# Altium schematic symbol library Regulator_Linear.SchLib: 1538 symbols (part 8 of 9)
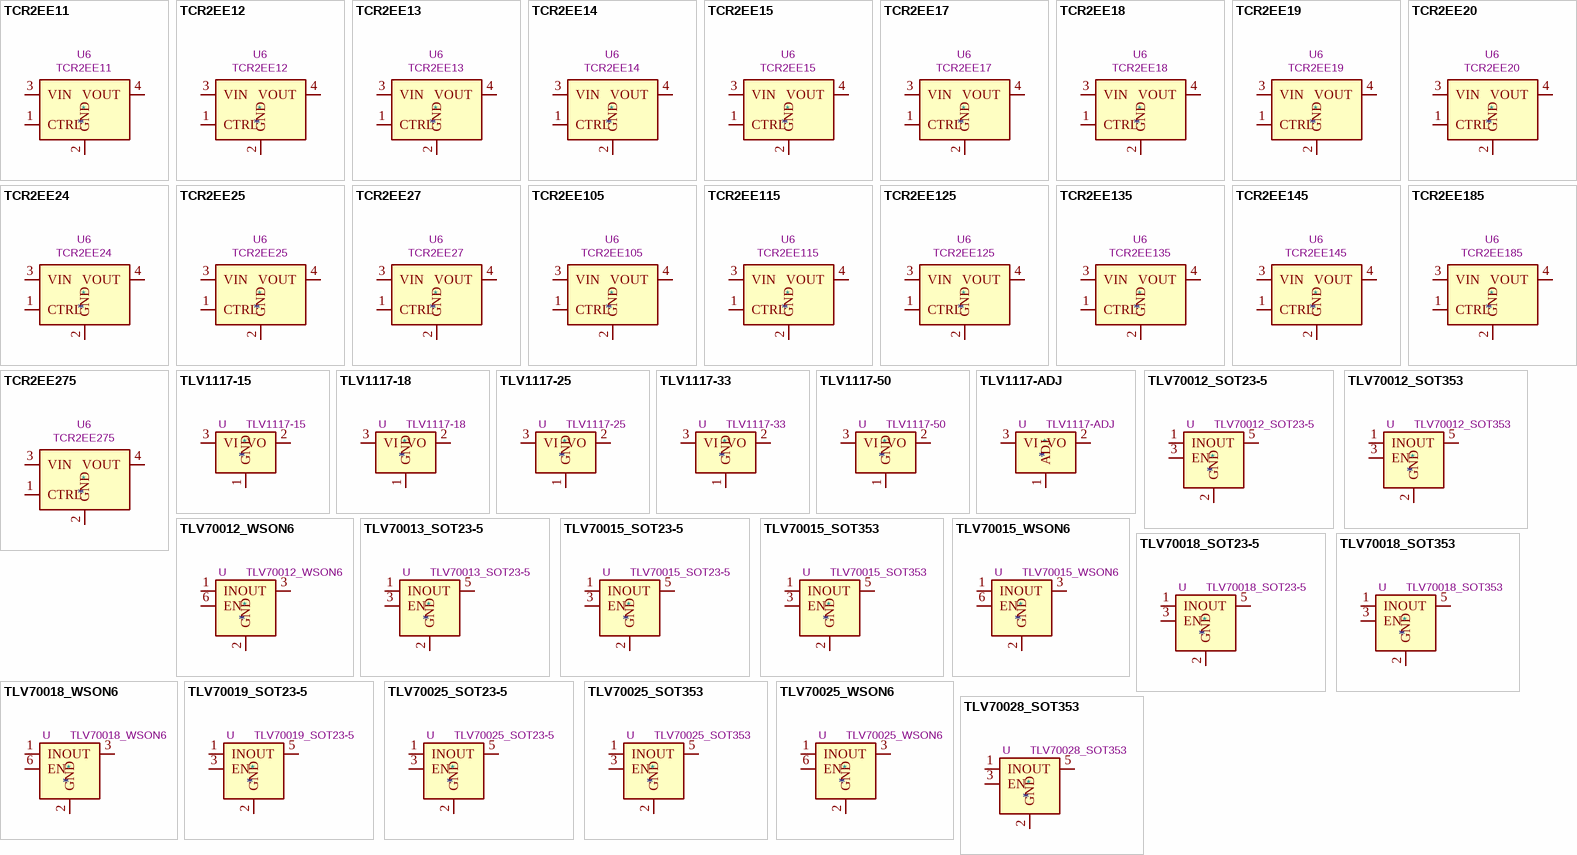
[diagram p45: symbols TCR2EE11 to TLV70028_SOT353]

## TLV1117-ADJ
designator *  value TLV1117-ADJ  Reference: U
ki_keywords: linear regulator ldo adjustable positive; ki_description: 800mA Low-Dropout Linear Regulator, adjustable output, TO-220/TO-252/TO-263/SOT-223; ki_fp_filters: SOT?223* TO?263* TO?252* TO?220*; Datasheet: http://www.ti.com/lit/ds/symlink/tlv1117.pdf
pins: 1 ADJ, 2 VO, 3 VI

## TLV70012_SOT23-5
designator *  value TLV70012_SOT23-5  Reference: U
ki_keywords: 200mA LDO Regulator Fixed Positive; ki_description: 200mA Low Dropout Voltage Regulator, Fixed Output 1.2V, SOT-23-5; ki_fp_filters: SOT?23*; Footprint: Package_TO_SOT_SMD:SOT-23-5; Datasheet: http://www.ti.com/lit/ds/symlink/tlv700.pdf
pins: 1 IN, 2 GND, 3 EN, 4 NC hidden, 5 OUT

## TLV70012_SOT353
designator *  value TLV70012_SOT353  Reference: U
ki_keywords: 200mA LDO Regulator Fixed Positive; ki_description: 200mA Low Dropout Voltage Regulator, Fixed Output 1.2V, SOT-23-5/SC-70-5/SOT-353; ki_fp_filters: SOT*353*; Footprint: Package_TO_SOT_SMD:SOT-353_SC-70-5; Datasheet: http://www.ti.com/lit/ds/symlink/tlv700.pdf
pins: 1 IN, 2 GND, 3 EN, 4 NC hidden, 5 OUT

## TLV70012_WSON6
designator *  value TLV70012_WSON6  Reference: U
ki_keywords: 200mA LDO Regulator Fixed Positive; ki_description: 200mA Low Dropout Voltage Regulator, Fixed Output 1.2V, WSON6; ki_fp_filters: WSON*; Footprint: Package_SON:WSON-6_1.5x1.5mm_P0.5mm; Datasheet: http://www.ti.com/lit/ds/symlink/tlv700.pdf
pins: 1 IN, 2 GND, 3 OUT, 4 NC hidden, 5 NC hidden, 6 EN

## TLV70013_SOT23-5
designator *  value TLV70013_SOT23-5  Reference: U
ki_keywords: 200mA LDO Regulator Fixed Positive; ki_description: 200mA Low Dropout Voltage Regulator, Fixed Output 1.3V, SOT-23-5; ki_fp_filters: SOT?23*; Footprint: Package_TO_SOT_SMD:SOT-23-5; Datasheet: http://www.ti.com/lit/ds/symlink/tlv700.pdf
pins: 1 IN, 2 GND, 3 EN, 4 NC hidden, 5 OUT

## TLV70015_SOT23-5
designator *  value TLV70015_SOT23-5  Reference: U
ki_keywords: 200mA LDO Regulator Fixed Positive; ki_description: 200mA Low Dropout Voltage Regulator, Fixed Output 1.5V, SOT-23-5; ki_fp_filters: SOT?23*; Footprint: Package_TO_SOT_SMD:SOT-23-5; Datasheet: http://www.ti.com/lit/ds/symlink/tlv700.pdf
pins: 1 IN, 2 GND, 3 EN, 4 NC hidden, 5 OUT

## TLV70015_SOT353
designator *  value TLV70015_SOT353  Reference: U
ki_keywords: 200mA LDO Regulator Fixed Positive; ki_description: 200mA Low Dropout Voltage Regulator, Fixed Output 1.5V, SOT-23-5/SC-70-5/SOT-353; ki_fp_filters: SOT*353*; Footprint: Package_TO_SOT_SMD:SOT-353_SC-70-5; Datasheet: http://www.ti.com/lit/ds/symlink/tlv700.pdf
pins: 1 IN, 2 GND, 3 EN, 4 NC hidden, 5 OUT

## TLV70015_WSON6
designator *  value TLV70015_WSON6  Reference: U
ki_keywords: 200mA LDO Regulator Fixed Positive; ki_description: 200mA Low Dropout Voltage Regulator, Fixed Output 1.5V, WSON6; ki_fp_filters: WSON*; Footprint: Package_SON:WSON-6_1.5x1.5mm_P0.5mm; Datasheet: http://www.ti.com/lit/ds/symlink/tlv700.pdf
pins: 1 IN, 2 GND, 3 OUT, 4 NC hidden, 5 NC hidden, 6 EN

## TLV70018_SOT23-5
designator *  value TLV70018_SOT23-5  Reference: U
ki_keywords: 200mA LDO Regulator Fixed Positive; ki_description: 200mA Low Dropout Voltage Regulator, Fixed Output 1.8V, SOT-23-5; ki_fp_filters: SOT?23*; Footprint: Package_TO_SOT_SMD:SOT-23-5; Datasheet: http://www.ti.com/lit/ds/symlink/tlv700.pdf
pins: 1 IN, 2 GND, 3 EN, 4 NC hidden, 5 OUT

## TLV70018_SOT353
designator *  value TLV70018_SOT353  Reference: U
ki_keywords: 200mA LDO Regulator Fixed Positive; ki_description: 200mA Low Dropout Voltage Regulator, Fixed Output 1.8V, SC70-5; ki_fp_filters: SOT*353*; Footprint: Package_TO_SOT_SMD:SOT-353_SC-70-5; Datasheet: http://www.ti.com/lit/ds/symlink/tlv700.pdf
pins: 1 IN, 2 GND, 3 EN, 4 NC hidden, 5 OUT

## TLV70018_WSON6
designator *  value TLV70018_WSON6  Reference: U
ki_keywords: 200mA LDO Regulator Fixed Positive; ki_description: 200mA Low Dropout Voltage Regulator, Fixed Output 1.8V, WSON6; ki_fp_filters: WSON*; Footprint: Package_SON:WSON-6_1.5x1.5mm_P0.5mm; Datasheet: http://www.ti.com/lit/ds/symlink/tlv700.pdf
pins: 1 IN, 2 GND, 3 OUT, 4 NC hidden, 5 NC hidden, 6 EN

## TLV70019_SOT23-5
designator *  value TLV70019_SOT23-5  Reference: U
ki_keywords: 200mA LDO Regulator Fixed Positive; ki_description: 200mA Low Dropout Voltage Regulator, Fixed Output 1.9V, SOT-23-5; ki_fp_filters: SOT?23*; Footprint: Package_TO_SOT_SMD:SOT-23-5; Datasheet: http://www.ti.com/lit/ds/symlink/tlv700.pdf
pins: 1 IN, 2 GND, 3 EN, 4 NC hidden, 5 OUT

## TLV70025_SOT23-5
designator *  value TLV70025_SOT23-5  Reference: U
ki_keywords: 200mA LDO Regulator Fixed Positive; ki_description: 200mA Low Dropout Voltage Regulator, Fixed Output 2.5V, SOT-23-5; ki_fp_filters: SOT?23*; Footprint: Package_TO_SOT_SMD:SOT-23-5; Datasheet: http://www.ti.com/lit/ds/symlink/tlv700.pdf
pins: 1 IN, 2 GND, 3 EN, 4 NC hidden, 5 OUT

## TLV70025_SOT353
designator *  value TLV70025_SOT353  Reference: U
ki_keywords: 200mA LDO Regulator Fixed Positive; ki_description: 200mA Low Dropout Voltage Regulator, Fixed Output 2.5V, SC70-5; ki_fp_filters: SOT*353*; Footprint: Package_TO_SOT_SMD:SOT-353_SC-70-5; Datasheet: http://www.ti.com/lit/ds/symlink/tlv700.pdf
pins: 1 IN, 2 GND, 3 EN, 4 NC hidden, 5 OUT

## TLV70025_WSON6
designator *  value TLV70025_WSON6  Reference: U
ki_keywords: 200mA LDO Regulator Fixed Positive; ki_description: 200mA Low Dropout Voltage Regulator, Fixed Output 2.5V, WSON6; ki_fp_filters: WSON*; Footprint: Package_SON:WSON-6_1.5x1.5mm_P0.5mm; Datasheet: http://www.ti.com/lit/ds/symlink/tlv700.pdf
pins: 1 IN, 2 GND, 3 OUT, 4 NC hidden, 5 NC hidden, 6 EN

## TLV70028_SOT353
designator *  value TLV70028_SOT353  Reference: U
ki_keywords: 200mA LDO Regulator Fixed Positive; ki_description: 200mA Low Dropout Voltage Regulator, Fixed Output 2.8V, SC70-5; ki_fp_filters: SOT*353*; Footprint: Package_TO_SOT_SMD:SOT-353_SC-70-5; Datasheet: http://www.ti.com/lit/ds/symlink/tlv700.pdf
pins: 1 IN, 2 GND, 3 EN, 4 NC hidden, 5 OUT

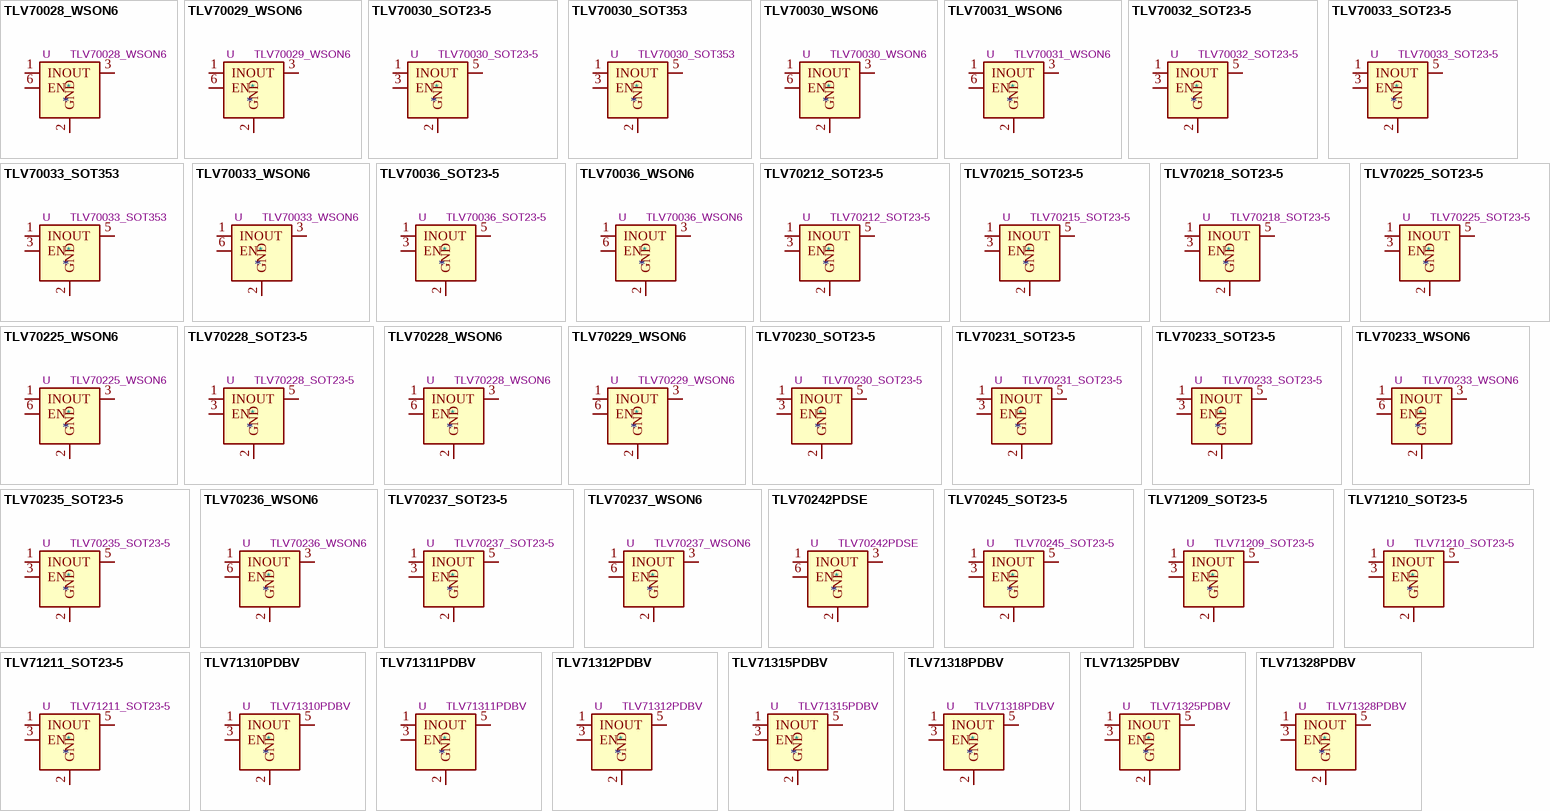
[diagram p32: symbols TLV70028_WSON6 to TLV71328PDBV]

## TLV70028_WSON6
designator *  value TLV70028_WSON6  Reference: U
ki_keywords: 200mA LDO Regulator Fixed Positive; ki_description: 200mA Low Dropout Voltage Regulator, Fixed Output 2.8V, WSON6; ki_fp_filters: WSON*; Footprint: Package_SON:WSON-6_1.5x1.5mm_P0.5mm; Datasheet: http://www.ti.com/lit/ds/symlink/tlv700.pdf
pins: 1 IN, 2 GND, 3 OUT, 4 NC hidden, 5 NC hidden, 6 EN

## TLV70029_WSON6
designator *  value TLV70029_WSON6  Reference: U
ki_keywords: 200mA LDO Regulator Fixed Positive; ki_description: 200mA Low Dropout Voltage Regulator, Fixed Output 2.9V, WSON6; ki_fp_filters: WSON*; Footprint: Package_SON:WSON-6_1.5x1.5mm_P0.5mm; Datasheet: http://www.ti.com/lit/ds/symlink/tlv700.pdf
pins: 1 IN, 2 GND, 3 OUT, 4 NC hidden, 5 NC hidden, 6 EN

## TLV70030_SOT23-5
designator *  value TLV70030_SOT23-5  Reference: U
ki_keywords: 200mA LDO Regulator Fixed Positive; ki_description: 200mA Low Dropout Voltage Regulator, Fixed Output 3.0V, SOT-23-5; ki_fp_filters: SOT?23*; Footprint: Package_TO_SOT_SMD:SOT-23-5; Datasheet: http://www.ti.com/lit/ds/symlink/tlv700.pdf
pins: 1 IN, 2 GND, 3 EN, 4 NC hidden, 5 OUT

## TLV70030_SOT353
designator *  value TLV70030_SOT353  Reference: U
ki_keywords: 200mA LDO Regulator Fixed Positive; ki_description: 200mA Low Dropout Voltage Regulator, Fixed Output 3V, SC70-5; ki_fp_filters: SOT*353*; Footprint: Package_TO_SOT_SMD:SOT-353_SC-70-5; Datasheet: http://www.ti.com/lit/ds/symlink/tlv700.pdf
pins: 1 IN, 2 GND, 3 EN, 4 NC hidden, 5 OUT

## TLV70030_WSON6
designator *  value TLV70030_WSON6  Reference: U
ki_keywords: 200mA LDO Regulator Fixed Positive; ki_description: 200mA Low Dropout Voltage Regulator, Fixed Output 3V, WSON6; ki_fp_filters: WSON*; Footprint: Package_SON:WSON-6_1.5x1.5mm_P0.5mm; Datasheet: http://www.ti.com/lit/ds/symlink/tlv700.pdf
pins: 1 IN, 2 GND, 3 OUT, 4 NC hidden, 5 NC hidden, 6 EN

## TLV70031_WSON6
designator *  value TLV70031_WSON6  Reference: U
ki_keywords: 200mA LDO Regulator Fixed Positive; ki_description: 200mA Low Dropout Voltage Regulator, Fixed Output 3.1V, WSON6; ki_fp_filters: WSON*; Footprint: Package_SON:WSON-6_1.5x1.5mm_P0.5mm; Datasheet: http://www.ti.com/lit/ds/symlink/tlv700.pdf
pins: 1 IN, 2 GND, 3 OUT, 4 NC hidden, 5 NC hidden, 6 EN

## TLV70032_SOT23-5
designator *  value TLV70032_SOT23-5  Reference: U
ki_keywords: 200mA LDO Regulator Fixed Positive; ki_description: 200mA Low Dropout Voltage Regulator, Fixed Output 3.2V, SOT-23-5; ki_fp_filters: SOT?23*; Footprint: Package_TO_SOT_SMD:SOT-23-5; Datasheet: http://www.ti.com/lit/ds/symlink/tlv700.pdf
pins: 1 IN, 2 GND, 3 EN, 4 NC hidden, 5 OUT

## TLV70033_SOT23-5
designator *  value TLV70033_SOT23-5  Reference: U
ki_keywords: 200mA LDO Regulator Fixed Positive; ki_description: 200mA Low Dropout Voltage Regulator, Fixed Output 3.3V, SOT-23-5; ki_fp_filters: SOT?23*; Footprint: Package_TO_SOT_SMD:SOT-23-5; Datasheet: http://www.ti.com/lit/ds/symlink/tlv700.pdf
pins: 1 IN, 2 GND, 3 EN, 4 NC hidden, 5 OUT

## TLV70033_SOT353
designator *  value TLV70033_SOT353  Reference: U
ki_keywords: 200mA LDO Regulator Fixed Positive; ki_description: 200mA Low Dropout Voltage Regulator, Fixed Output 3.3V, SC70-5; ki_fp_filters: SOT*353*; Footprint: Package_TO_SOT_SMD:SOT-353_SC-70-5; Datasheet: http://www.ti.com/lit/ds/symlink/tlv700.pdf
pins: 1 IN, 2 GND, 3 EN, 4 NC hidden, 5 OUT

## TLV70033_WSON6
designator *  value TLV70033_WSON6  Reference: U
ki_keywords: 200mA LDO Regulator Fixed Positive; ki_description: 200mA Low Dropout Voltage Regulator, Fixed Output 3.3V, WSON6; ki_fp_filters: WSON*; Footprint: Package_SON:WSON-6_1.5x1.5mm_P0.5mm; Datasheet: http://www.ti.com/lit/ds/symlink/tlv700.pdf
pins: 1 IN, 2 GND, 3 OUT, 4 NC hidden, 5 NC hidden, 6 EN

## TLV70036_SOT23-5
designator *  value TLV70036_SOT23-5  Reference: U
ki_keywords: 200mA LDO Regulator Fixed Positive; ki_description: 200mA Low Dropout Voltage Regulator, Fixed Output 3.6V, SOT-23-5; ki_fp_filters: SOT?23*; Footprint: Package_TO_SOT_SMD:SOT-23-5; Datasheet: http://www.ti.com/lit/ds/symlink/tlv700.pdf
pins: 1 IN, 2 GND, 3 EN, 4 NC hidden, 5 OUT

## TLV70036_WSON6
designator *  value TLV70036_WSON6  Reference: U
ki_keywords: 200mA LDO Regulator Fixed Positive; ki_description: 200mA Low Dropout Voltage Regulator, Fixed Output 3.6V, WSON6; ki_fp_filters: WSON*; Footprint: Package_SON:WSON-6_1.5x1.5mm_P0.5mm; Datasheet: http://www.ti.com/lit/ds/symlink/tlv700.pdf
pins: 1 IN, 2 GND, 3 OUT, 4 NC hidden, 5 NC hidden, 6 EN

## TLV70212_SOT23-5
designator *  value TLV70212_SOT23-5  Reference: U
ki_keywords: 300mA LDO Regulator Fixed Positive; ki_description: 300mA Low Dropout Voltage Regulator, Fixed Output 1.2V, SOT-23-5; ki_fp_filters: SOT?23*; Footprint: Package_TO_SOT_SMD:SOT-23-5; Datasheet: http://www.ti.com/lit/ds/symlink/tlv702.pdf
pins: 1 IN, 2 GND, 3 EN, 4 NC hidden, 5 OUT

## TLV70215_SOT23-5
designator *  value TLV70215_SOT23-5  Reference: U
ki_keywords: 300mA LDO Regulator Fixed Positive; ki_description: 300mA Low Dropout Voltage Regulator, Fixed Output 1.5V, SOT-23-5; ki_fp_filters: SOT?23*; Footprint: Package_TO_SOT_SMD:SOT-23-5; Datasheet: http://www.ti.com/lit/ds/symlink/tlv702.pdf
pins: 1 IN, 2 GND, 3 EN, 4 NC hidden, 5 OUT

## TLV70218_SOT23-5
designator *  value TLV70218_SOT23-5  Reference: U
ki_keywords: 300mA LDO Regulator Fixed Positive; ki_description: 300mA Low Dropout Voltage Regulator, Fixed Output 1.8V, SOT-23-5; ki_fp_filters: SOT?23*; Footprint: Package_TO_SOT_SMD:SOT-23-5; Datasheet: http://www.ti.com/lit/ds/symlink/tlv702.pdf
pins: 1 IN, 2 GND, 3 EN, 4 NC hidden, 5 OUT

## TLV70225_SOT23-5
designator *  value TLV70225_SOT23-5  Reference: U
ki_keywords: 300mA LDO Regulator Fixed Positive; ki_description: 300mA Low Dropout Voltage Regulator, Fixed Output 2.5V, SOT-23-5; ki_fp_filters: SOT?23*; Footprint: Package_TO_SOT_SMD:SOT-23-5; Datasheet: http://www.ti.com/lit/ds/symlink/tlv702.pdf
pins: 1 IN, 2 GND, 3 EN, 4 NC hidden, 5 OUT

## TLV70225_WSON6
designator *  value TLV70225_WSON6  Reference: U
ki_keywords: 300mA LDO Regulator Fixed Positive; ki_description: 300mA Low Dropout Voltage Regulator, Fixed Output 2.5V, WSON6; ki_fp_filters: WSON*; Footprint: Package_SON:WSON-6_1.5x1.5mm_P0.5mm; Datasheet: http://www.ti.com/lit/ds/symlink/tlv702.pdf
pins: 1 IN, 2 GND, 3 OUT, 4 NC hidden, 5 NC hidden, 6 EN

## TLV70228_SOT23-5
designator *  value TLV70228_SOT23-5  Reference: U
ki_keywords: 300mA LDO Regulator Fixed Positive; ki_description: 300mA Low Dropout Voltage Regulator, Fixed Output 2.8V, SOT-23-5; ki_fp_filters: SOT?23*; Footprint: Package_TO_SOT_SMD:SOT-23-5; Datasheet: http://www.ti.com/lit/ds/symlink/tlv702.pdf
pins: 1 IN, 2 GND, 3 EN, 4 NC hidden, 5 OUT

## TLV70228_WSON6
designator *  value TLV70228_WSON6  Reference: U
ki_keywords: 300mA LDO Regulator Fixed Positive; ki_description: 300mA Low Dropout Voltage Regulator, Fixed Output 2.8V, WSON6; ki_fp_filters: WSON*; Footprint: Package_SON:WSON-6_1.5x1.5mm_P0.5mm; Datasheet: http://www.ti.com/lit/ds/symlink/tlv702.pdf
pins: 1 IN, 2 GND, 3 OUT, 4 NC hidden, 5 NC hidden, 6 EN

## TLV70229_WSON6
designator *  value TLV70229_WSON6  Reference: U
ki_keywords: 300mA LDO Regulator Fixed Positive; ki_description: 300mA Low Dropout Voltage Regulator, Fixed Output 2.9V, WSON6; ki_fp_filters: WSON*; Footprint: Package_SON:WSON-6_1.5x1.5mm_P0.5mm; Datasheet: http://www.ti.com/lit/ds/symlink/tlv702.pdf
pins: 1 IN, 2 GND, 3 OUT, 4 NC hidden, 5 NC hidden, 6 EN

## TLV70230_SOT23-5
designator *  value TLV70230_SOT23-5  Reference: U
ki_keywords: 300mA LDO Regulator Fixed Positive; ki_description: 300mA Low Dropout Voltage Regulator, Fixed Output 3V, SOT-23-5; ki_fp_filters: SOT?23*; Footprint: Package_TO_SOT_SMD:SOT-23-5; Datasheet: http://www.ti.com/lit/ds/symlink/tlv702.pdf
pins: 1 IN, 2 GND, 3 EN, 4 NC hidden, 5 OUT

## TLV70231_SOT23-5
designator *  value TLV70231_SOT23-5  Reference: U
ki_keywords: 300mA LDO Regulator Fixed Positive; ki_description: 300mA Low Dropout Voltage Regulator, Fixed Output 3.1V, SOT-23-5; ki_fp_filters: SOT?23*; Footprint: Package_TO_SOT_SMD:SOT-23-5; Datasheet: http://www.ti.com/lit/ds/symlink/tlv702.pdf
pins: 1 IN, 2 GND, 3 EN, 4 NC hidden, 5 OUT

## TLV70233_SOT23-5
designator *  value TLV70233_SOT23-5  Reference: U
ki_keywords: 300mA LDO Regulator Fixed Positive; ki_description: 300mA Low Dropout Voltage Regulator, Fixed Output 3.3V, SOT-23-5; ki_fp_filters: SOT?23*; Footprint: Package_TO_SOT_SMD:SOT-23-5; Datasheet: http://www.ti.com/lit/ds/symlink/tlv702.pdf
pins: 1 IN, 2 GND, 3 EN, 4 NC hidden, 5 OUT

## TLV70233_WSON6
designator *  value TLV70233_WSON6  Reference: U
ki_keywords: 300mA LDO Regulator Fixed Positive; ki_description: 300mA Low Dropout Voltage Regulator, Fixed Output 3.3V, WSON6; ki_fp_filters: WSON*; Footprint: Package_SON:WSON-6_1.5x1.5mm_P0.5mm; Datasheet: http://www.ti.com/lit/ds/symlink/tlv702.pdf
pins: 1 IN, 2 GND, 3 OUT, 4 NC hidden, 5 NC hidden, 6 EN

## TLV70235_SOT23-5
designator *  value TLV70235_SOT23-5  Reference: U
ki_keywords: 300mA LDO Regulator Fixed Positive; ki_description: 300mA Low Dropout Voltage Regulator, Fixed Output 3.5V, SOT-23-5; ki_fp_filters: SOT?23*; Footprint: Package_TO_SOT_SMD:SOT-23-5; Datasheet: http://www.ti.com/lit/ds/symlink/tlv702.pdf
pins: 1 IN, 2 GND, 3 EN, 4 NC hidden, 5 OUT

## TLV70236_WSON6
designator *  value TLV70236_WSON6  Reference: U
ki_keywords: 300mA LDO Regulator Fixed Positive; ki_description: 300mA Low Dropout Voltage Regulator, Fixed Output 3.6V, WSON6; ki_fp_filters: WSON*; Footprint: Package_SON:WSON-6_1.5x1.5mm_P0.5mm; Datasheet: http://www.ti.com/lit/ds/symlink/tlv702.pdf
pins: 1 IN, 2 GND, 3 OUT, 4 NC hidden, 5 NC hidden, 6 EN

## TLV70237_SOT23-5
designator *  value TLV70237_SOT23-5  Reference: U
ki_keywords: 300mA LDO Regulator Fixed Positive; ki_description: 300mA Low Dropout Voltage Regulator, Fixed Output 3.7V, SOT-23-5; ki_fp_filters: SOT?23*; Footprint: Package_TO_SOT_SMD:SOT-23-5; Datasheet: http://www.ti.com/lit/ds/symlink/tlv702.pdf
pins: 1 IN, 2 GND, 3 EN, 4 NC hidden, 5 OUT

## TLV70237_WSON6
designator *  value TLV70237_WSON6  Reference: U
ki_keywords: 300mA LDO Regulator Fixed Positive; ki_description: 300mA Low Dropout Voltage Regulator, Fixed Output 3.7V, WSON6; ki_fp_filters: WSON*; Footprint: Package_SON:WSON-6_1.5x1.5mm_P0.5mm; Datasheet: http://www.ti.com/lit/ds/symlink/tlv702.pdf
pins: 1 IN, 2 GND, 3 OUT, 4 NC hidden, 5 NC hidden, 6 EN

## TLV70242PDSE
designator *  value TLV70242PDSE  Reference: U
ki_keywords: 300mA LDO Regulator Fixed Positive; ki_description: 300mA Low Dropout Voltage Regulator, Fixed Output 4.2V, WSON6; ki_fp_filters: WSON*; Footprint: Package_SON:WSON-6_1.5x1.5mm_P0.5mm; Datasheet: http://www.ti.com/lit/ds/symlink/tlv702.pdf
pins: 1 IN, 2 GND, 3 OUT, 4 NC hidden, 5 NC hidden, 6 EN

## TLV70245_SOT23-5
designator *  value TLV70245_SOT23-5  Reference: U
ki_keywords: 300mA LDO Regulator Fixed Positive; ki_description: 300mA Low Dropout Voltage Regulator, Fixed Output 4.5V, SOT-23-5; ki_fp_filters: SOT?23*; Footprint: Package_TO_SOT_SMD:SOT-23-5; Datasheet: http://www.ti.com/lit/ds/symlink/tlv702.pdf
pins: 1 IN, 2 GND, 3 EN, 4 NC hidden, 5 OUT

## TLV71209_SOT23-5
designator *  value TLV71209_SOT23-5  Reference: U
ki_keywords: LDO Regulator Fixed Positive; ki_description: 300mA Low Dropout Voltage Regulator, Fixed Output 0.9V, SOT-23-5; ki_fp_filters: SOT?23*; Footprint: Package_TO_SOT_SMD:SOT-23-5; Datasheet: http://www.ti.com/lit/ds/symlink/tlv712.pdf
pins: 1 IN, 2 GND, 3 EN, 4 NC hidden, 5 OUT

## TLV71210_SOT23-5
designator *  value TLV71210_SOT23-5  Reference: U
ki_keywords: 300mA LDO Regulator Fixed Positive; ki_description: 300mA Low Dropout Voltage Regulator, Fixed Output 1.0V, SOT-23-5; ki_fp_filters: SOT?23*; Footprint: Package_TO_SOT_SMD:SOT-23-5; Datasheet: http://www.ti.com/lit/ds/symlink/tlv712.pdf
pins: 1 IN, 2 GND, 3 EN, 4 NC hidden, 5 OUT

## TLV71211_SOT23-5
designator *  value TLV71211_SOT23-5  Reference: U
ki_keywords: 300mA LDO Regulator Fixed Positive; ki_description: 300mA Low Dropout Voltage Regulator, Fixed Output 1.1V, SOT-23-5; ki_fp_filters: SOT?23*; Footprint: Package_TO_SOT_SMD:SOT-23-5; Datasheet: http://www.ti.com/lit/ds/symlink/tlv712.pdf
pins: 1 IN, 2 GND, 3 EN, 4 NC hidden, 5 OUT

## TLV71310PDBV
designator *  value TLV71310PDBV  Reference: U
ki_keywords: LDO Regulator Fixed Positive; ki_description: 150mA Low Dropout Voltage Regulator, Fixed Output 1.0V, SOT-23-5; ki_fp_filters: SOT?23*; Footprint: Package_TO_SOT_SMD:SOT-23-5; Datasheet: http://www.ti.com/lit/ds/symlink/tlv713p.pdf
pins: 1 IN, 2 GND, 3 EN, 4 NC hidden, 5 OUT

## TLV71311PDBV
designator *  value TLV71311PDBV  Reference: U
ki_keywords: LDO Regulator Fixed Positive; ki_description: 150mA Low Dropout Voltage Regulator, Fixed Output 1.1V, SOT-23-5; ki_fp_filters: SOT?23*; Footprint: Package_TO_SOT_SMD:SOT-23-5; Datasheet: http://www.ti.com/lit/ds/symlink/tlv713p.pdf
pins: 1 IN, 2 GND, 3 EN, 4 NC hidden, 5 OUT

## TLV71312PDBV
designator *  value TLV71312PDBV  Reference: U
ki_keywords: LDO Regulator Fixed Positive; ki_description: 150mA Low Dropout Voltage Regulator, Fixed Output 1.2V, SOT-23-5; ki_fp_filters: SOT?23*; Footprint: Package_TO_SOT_SMD:SOT-23-5; Datasheet: http://www.ti.com/lit/ds/symlink/tlv713p.pdf
pins: 1 IN, 2 GND, 3 EN, 4 NC hidden, 5 OUT

## TLV71315PDBV
designator *  value TLV71315PDBV  Reference: U
ki_keywords: LDO Regulator Fixed Positive; ki_description: 150mA Low Dropout Voltage Regulator, Fixed Output 1.5V, SOT-23-5; ki_fp_filters: SOT?23*; Footprint: Package_TO_SOT_SMD:SOT-23-5; Datasheet: http://www.ti.com/lit/ds/symlink/tlv713p.pdf
pins: 1 IN, 2 GND, 3 EN, 4 NC hidden, 5 OUT

## TLV71318PDBV
designator *  value TLV71318PDBV  Reference: U
ki_keywords: LDO Regulator Fixed Positive; ki_description: 150mA Low Dropout Voltage Regulator, Fixed Output 1.8V, SOT-23-5; ki_fp_filters: SOT?23*; Footprint: Package_TO_SOT_SMD:SOT-23-5; Datasheet: http://www.ti.com/lit/ds/symlink/tlv713p.pdf
pins: 1 IN, 2 GND, 3 EN, 4 NC hidden, 5 OUT

## TLV71325PDBV
designator *  value TLV71325PDBV  Reference: U
ki_keywords: LDO Regulator Fixed Positive; ki_description: 150mA Low Dropout Voltage Regulator, Fixed Output 2.5V, SOT-23-5; ki_fp_filters: SOT?23*; Footprint: Package_TO_SOT_SMD:SOT-23-5; Datasheet: http://www.ti.com/lit/ds/symlink/tlv713p.pdf
pins: 1 IN, 2 GND, 3 EN, 4 NC hidden, 5 OUT

## TLV71328PDBV
designator *  value TLV71328PDBV  Reference: U
ki_keywords: LDO Regulator Fixed Positive; ki_description: 150mA Low Dropout Voltage Regulator, Fixed Output 2.8V, SOT-23-5; ki_fp_filters: SOT?23*; Footprint: Package_TO_SOT_SMD:SOT-23-5; Datasheet: http://www.ti.com/lit/ds/symlink/tlv713p.pdf
pins: 1 IN, 2 GND, 3 EN, 4 NC hidden, 5 OUT

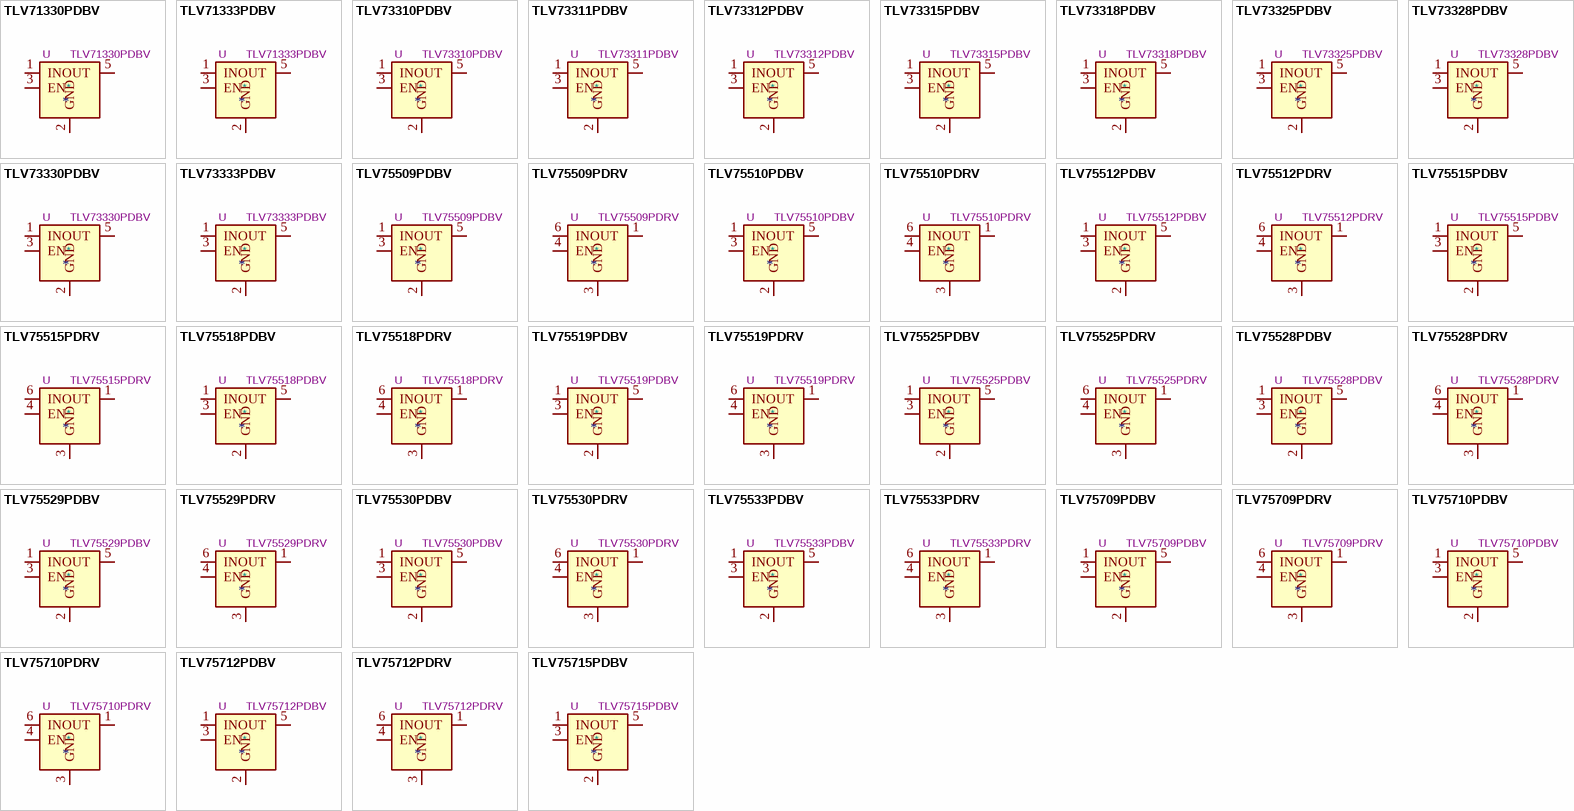
[diagram p33: symbols TLV71330PDBV to TLV75715PDBV]

## TLV71330PDBV
designator *  value TLV71330PDBV  Reference: U
ki_keywords: LDO Regulator Fixed Positive; ki_description: 150mA Low Dropout Voltage Regulator, Fixed Output 3.0V, SOT-23-5; ki_fp_filters: SOT?23*; Footprint: Package_TO_SOT_SMD:SOT-23-5; Datasheet: http://www.ti.com/lit/ds/symlink/tlv713p.pdf
pins: 1 IN, 2 GND, 3 EN, 4 NC hidden, 5 OUT

## TLV71333PDBV
designator *  value TLV71333PDBV  Reference: U
ki_keywords: LDO Regulator Fixed Positive; ki_description: 150mA Low Dropout Voltage Regulator, Fixed Output 3.3V, SOT-23-5; ki_fp_filters: SOT?23*; Footprint: Package_TO_SOT_SMD:SOT-23-5; Datasheet: http://www.ti.com/lit/ds/symlink/tlv713p.pdf
pins: 1 IN, 2 GND, 3 EN, 4 NC hidden, 5 OUT

## TLV73310PDBV
designator *  value TLV73310PDBV  Reference: U
ki_keywords: 300mA LDO Regulator Fixed Positive Capacitor-Free; ki_description: 300mA Capacitor-Free Low Dropout Voltage Regulator, Fixed Output 1.0V, SOT-23-5; ki_fp_filters: SOT?23*; Footprint: Package_TO_SOT_SMD:SOT-23-5; Datasheet: http://www.ti.com/lit/ds/symlink/tlv733p.pdf
pins: 1 IN, 2 GND, 3 EN, 4 NC hidden, 5 OUT

## TLV73311PDBV
designator *  value TLV73311PDBV  Reference: U
ki_keywords: 300mA LDO Regulator Fixed Positive Capacitor-Free; ki_description: 300mA Capacitor-Free Low Dropout Voltage Regulator, Fixed Output 1.1V, SOT-23-5; ki_fp_filters: SOT?23*; Footprint: Package_TO_SOT_SMD:SOT-23-5; Datasheet: http://www.ti.com/lit/ds/symlink/tlv733p.pdf
pins: 1 IN, 2 GND, 3 EN, 4 NC hidden, 5 OUT

## TLV73312PDBV
designator *  value TLV73312PDBV  Reference: U
ki_keywords: 300mA LDO Regulator Fixed Positive Capacitor-Free; ki_description: 300mA Capacitor-Free Low Dropout Voltage Regulator, Fixed Output 1.2V, SOT-23-5; ki_fp_filters: SOT?23*; Footprint: Package_TO_SOT_SMD:SOT-23-5; Datasheet: http://www.ti.com/lit/ds/symlink/tlv733p.pdf
pins: 1 IN, 2 GND, 3 EN, 4 NC hidden, 5 OUT

## TLV73315PDBV
designator *  value TLV73315PDBV  Reference: U
ki_keywords: 300mA LDO Regulator Fixed Positive Capacitor-Free; ki_description: 300mA Capacitor-Free Low Dropout Voltage Regulator, Fixed Output 1.5V, SOT-23-5; ki_fp_filters: SOT?23*; Footprint: Package_TO_SOT_SMD:SOT-23-5; Datasheet: http://www.ti.com/lit/ds/symlink/tlv733p.pdf
pins: 1 IN, 2 GND, 3 EN, 4 NC hidden, 5 OUT

## TLV73318PDBV
designator *  value TLV73318PDBV  Reference: U
ki_keywords: 300mA LDO Regulator Fixed Positive Capacitor-Free; ki_description: 300mA Capacitor-Free Low Dropout Voltage Regulator, Fixed Output 1.8V, SOT-23-5; ki_fp_filters: SOT?23*; Footprint: Package_TO_SOT_SMD:SOT-23-5; Datasheet: http://www.ti.com/lit/ds/symlink/tlv733p.pdf
pins: 1 IN, 2 GND, 3 EN, 4 NC hidden, 5 OUT

## TLV73325PDBV
designator *  value TLV73325PDBV  Reference: U
ki_keywords: 300mA LDO Regulator Fixed Positive Capacitor-Free; ki_description: 300mA Capacitor-Free Low Dropout Voltage Regulator, Fixed Output 2.5V, SOT-23-5; ki_fp_filters: SOT?23*; Footprint: Package_TO_SOT_SMD:SOT-23-5; Datasheet: http://www.ti.com/lit/ds/symlink/tlv733p.pdf
pins: 1 IN, 2 GND, 3 EN, 4 NC hidden, 5 OUT

## TLV73328PDBV
designator *  value TLV73328PDBV  Reference: U
ki_keywords: 300mA LDO Regulator Fixed Positive Capacitor-Free; ki_description: 300mA Capacitor-Free Low Dropout Voltage Regulator, Fixed Output 2.8V, SOT-23-5; ki_fp_filters: SOT?23*; Footprint: Package_TO_SOT_SMD:SOT-23-5; Datasheet: http://www.ti.com/lit/ds/symlink/tlv733p.pdf
pins: 1 IN, 2 GND, 3 EN, 4 NC hidden, 5 OUT

## TLV73330PDBV
designator *  value TLV73330PDBV  Reference: U
ki_keywords: 300mA LDO Regulator Fixed Positive Capacitor-Free; ki_description: 300mA Capacitor-Free Low Dropout Voltage Regulator, Fixed Output 3.0V, SOT-23-5; ki_fp_filters: SOT?23*; Footprint: Package_TO_SOT_SMD:SOT-23-5; Datasheet: http://www.ti.com/lit/ds/symlink/tlv733p.pdf
pins: 1 IN, 2 GND, 3 EN, 4 NC hidden, 5 OUT

## TLV73333PDBV
designator *  value TLV73333PDBV  Reference: U
ki_keywords: 300mA LDO Regulator Fixed Positive Capacitor-Free; ki_description: 300mA Capacitor-Free Low Dropout Voltage Regulator, Fixed Output 3.3V, SOT-23-5; ki_fp_filters: SOT?23*; Footprint: Package_TO_SOT_SMD:SOT-23-5; Datasheet: http://www.ti.com/lit/ds/symlink/tlv733p.pdf
pins: 1 IN, 2 GND, 3 EN, 4 NC hidden, 5 OUT

## TLV75509PDBV
designator *  value TLV75509PDBV  Reference: U
ki_keywords: LDO Regulator Fixed Positive; ki_description: 500mA Low IQ Small Size Low Dropout Voltage Regulator, Fixed Output 0.9V, SOT-23-5; ki_fp_filters: SOT?23*; Footprint: Package_TO_SOT_SMD:SOT-23-5; Datasheet: http://www.ti.com/lit/ds/symlink/tlv755p.pdf
pins: 1 IN, 2 GND, 3 EN, 4 NC hidden, 5 OUT

## TLV75509PDRV
designator *  value TLV75509PDRV  Reference: U
ki_keywords: LDO Regulator Fixed Positive; ki_description: 500mA Low Dropout Voltage Regulator, Fixed Output 0.9V, WSON6; ki_fp_filters: WSON*1EP*2x2mm*P0.65mm*; Footprint: Package_SON:WSON-6-1EP_2x2mm_P0.65mm_EP1x1.6mm; Datasheet: http://www.ti.com/lit/ds/symlink/tlv755p.pdf
pins: 1 OUT, 2 NC hidden, 3 GND, 4 EN, 5 NC hidden, 6 IN, 7 GND hidden

## TLV75510PDBV
designator *  value TLV75510PDBV  Reference: U
ki_keywords: LDO Regulator Fixed Positive; ki_description: 500mA Low IQ Small Size Low Dropout Voltage Regulator, Fixed Output 1.0V, SOT-23-5; ki_fp_filters: SOT?23*; Footprint: Package_TO_SOT_SMD:SOT-23-5; Datasheet: http://www.ti.com/lit/ds/symlink/tlv755p.pdf
pins: 1 IN, 2 GND, 3 EN, 4 NC hidden, 5 OUT

## TLV75510PDRV
designator *  value TLV75510PDRV  Reference: U
ki_keywords: LDO Regulator Fixed Positive; ki_description: 500mA Low Dropout Voltage Regulator, Fixed Output 1.0V, WSON6; ki_fp_filters: WSON*1EP*2x2mm*P0.65mm*; Footprint: Package_SON:WSON-6-1EP_2x2mm_P0.65mm_EP1x1.6mm; Datasheet: http://www.ti.com/lit/ds/symlink/tlv755p.pdf
pins: 1 OUT, 2 NC hidden, 3 GND, 4 EN, 5 NC hidden, 6 IN, 7 GND hidden

## TLV75512PDBV
designator *  value TLV75512PDBV  Reference: U
ki_keywords: LDO Regulator Fixed Positive; ki_description: 500mA Low IQ Small Size Low Dropout Voltage Regulator, Fixed Output 1.2V, SOT-23-5; ki_fp_filters: SOT?23*; Footprint: Package_TO_SOT_SMD:SOT-23-5; Datasheet: http://www.ti.com/lit/ds/symlink/tlv755p.pdf
pins: 1 IN, 2 GND, 3 EN, 4 NC hidden, 5 OUT

## TLV75512PDRV
designator *  value TLV75512PDRV  Reference: U
ki_keywords: LDO Regulator Fixed Positive; ki_description: 500mA Low Dropout Voltage Regulator, Fixed Output 1.2V, WSON6; ki_fp_filters: WSON*1EP*2x2mm*P0.65mm*; Footprint: Package_SON:WSON-6-1EP_2x2mm_P0.65mm_EP1x1.6mm; Datasheet: http://www.ti.com/lit/ds/symlink/tlv755p.pdf
pins: 1 OUT, 2 NC hidden, 3 GND, 4 EN, 5 NC hidden, 6 IN, 7 GND hidden

## TLV75515PDBV
designator *  value TLV75515PDBV  Reference: U
ki_keywords: LDO Regulator Fixed Positive; ki_description: 500mA Low Dropout Voltage Regulator, Fixed Output 1.5V, SOT-23-5; ki_fp_filters: SOT?23*; Footprint: Package_TO_SOT_SMD:SOT-23-5; Datasheet: http://www.ti.com/lit/ds/symlink/tlv755p.pdf
pins: 1 IN, 2 GND, 3 EN, 4 NC hidden, 5 OUT

## TLV75515PDRV
designator *  value TLV75515PDRV  Reference: U
ki_keywords: LDO Regulator Fixed Positive; ki_description: 500mA Low Dropout Voltage Regulator, Fixed Output 1.5V, WSON6; ki_fp_filters: WSON*1EP*2x2mm*P0.65mm*; Footprint: Package_SON:WSON-6-1EP_2x2mm_P0.65mm_EP1x1.6mm; Datasheet: http://www.ti.com/lit/ds/symlink/tlv755p.pdf
pins: 1 OUT, 2 NC hidden, 3 GND, 4 EN, 5 NC hidden, 6 IN, 7 GND hidden

## TLV75518PDBV
designator *  value TLV75518PDBV  Reference: U
ki_keywords: LDO Regulator Fixed Positive; ki_description: 500mA Low Dropout Voltage Regulator, Fixed Output 1.8V, SOT-23-5; ki_fp_filters: SOT?23*; Footprint: Package_TO_SOT_SMD:SOT-23-5; Datasheet: http://www.ti.com/lit/ds/symlink/tlv755p.pdf
pins: 1 IN, 2 GND, 3 EN, 4 NC hidden, 5 OUT

## TLV75518PDRV
designator *  value TLV75518PDRV  Reference: U
ki_keywords: LDO Regulator Fixed Positive; ki_description: 500mA Low Dropout Voltage Regulator, Fixed Output 1.8V, WSON6; ki_fp_filters: WSON*1EP*2x2mm*P0.65mm*; Footprint: Package_SON:WSON-6-1EP_2x2mm_P0.65mm_EP1x1.6mm; Datasheet: http://www.ti.com/lit/ds/symlink/tlv755p.pdf
pins: 1 OUT, 2 NC hidden, 3 GND, 4 EN, 5 NC hidden, 6 IN, 7 GND hidden

## TLV75519PDBV
designator *  value TLV75519PDBV  Reference: U
ki_keywords: LDO Regulator Fixed Positive; ki_description: 500mA Low Dropout Voltage Regulator, Fixed Output 1.9V, SOT-23-5; ki_fp_filters: SOT?23*; Footprint: Package_TO_SOT_SMD:SOT-23-5; Datasheet: http://www.ti.com/lit/ds/symlink/tlv755p.pdf
pins: 1 IN, 2 GND, 3 EN, 4 NC hidden, 5 OUT

## TLV75519PDRV
designator *  value TLV75519PDRV  Reference: U
ki_keywords: LDO Regulator Fixed Positive; ki_description: 500mA Low Dropout Voltage Regulator, Fixed Output 1.9V, WSON6; ki_fp_filters: WSON*1EP*2x2mm*P0.65mm*; Footprint: Package_SON:WSON-6-1EP_2x2mm_P0.65mm_EP1x1.6mm; Datasheet: http://www.ti.com/lit/ds/symlink/tlv755p.pdf
pins: 1 OUT, 2 NC hidden, 3 GND, 4 EN, 5 NC hidden, 6 IN, 7 GND hidden

## TLV75525PDBV
designator *  value TLV75525PDBV  Reference: U
ki_keywords: LDO Regulator Fixed Positive; ki_description: 500mA Low Dropout Voltage Regulator, Fixed Output 2.5V, SOT-23-5; ki_fp_filters: SOT?23*; Footprint: Package_TO_SOT_SMD:SOT-23-5; Datasheet: http://www.ti.com/lit/ds/symlink/tlv755p.pdf
pins: 1 IN, 2 GND, 3 EN, 4 NC hidden, 5 OUT

## TLV75525PDRV
designator *  value TLV75525PDRV  Reference: U
ki_keywords: LDO Regulator Fixed Positive; ki_description: 500mA Low Dropout Voltage Regulator, Fixed Output 2.5V, WSON6; ki_fp_filters: WSON*1EP*2x2mm*P0.65mm*; Footprint: Package_SON:WSON-6-1EP_2x2mm_P0.65mm_EP1x1.6mm; Datasheet: http://www.ti.com/lit/ds/symlink/tlv755p.pdf
pins: 1 OUT, 2 NC hidden, 3 GND, 4 EN, 5 NC hidden, 6 IN, 7 GND hidden

## TLV75528PDBV
designator *  value TLV75528PDBV  Reference: U
ki_keywords: LDO Regulator Fixed Positive; ki_description: 500mA Low Dropout Voltage Regulator, Fixed Output 2.8V, SOT-23-5; ki_fp_filters: SOT?23*; Footprint: Package_TO_SOT_SMD:SOT-23-5; Datasheet: http://www.ti.com/lit/ds/symlink/tlv755p.pdf
pins: 1 IN, 2 GND, 3 EN, 4 NC hidden, 5 OUT

## TLV75528PDRV
designator *  value TLV75528PDRV  Reference: U
ki_keywords: LDO Regulator Fixed Positive; ki_description: 500mA Low Dropout Voltage Regulator, Fixed Output 2.8V, WSON6; ki_fp_filters: WSON*1EP*2x2mm*P0.65mm*; Footprint: Package_SON:WSON-6-1EP_2x2mm_P0.65mm_EP1x1.6mm; Datasheet: http://www.ti.com/lit/ds/symlink/tlv755p.pdf
pins: 1 OUT, 2 NC hidden, 3 GND, 4 EN, 5 NC hidden, 6 IN, 7 GND hidden

## TLV75529PDBV
designator *  value TLV75529PDBV  Reference: U
ki_keywords: LDO Regulator Fixed Positive; ki_description: 500mA Low Dropout Voltage Regulator, Fixed Output 2.9V, SOT-23-5; ki_fp_filters: SOT?23*; Footprint: Package_TO_SOT_SMD:SOT-23-5; Datasheet: http://www.ti.com/lit/ds/symlink/tlv755p.pdf
pins: 1 IN, 2 GND, 3 EN, 4 NC hidden, 5 OUT

## TLV75529PDRV
designator *  value TLV75529PDRV  Reference: U
ki_keywords: LDO Regulator Fixed Positive; ki_description: 500mA Low Dropout Voltage Regulator, Fixed Output 2.9V, WSON6; ki_fp_filters: WSON*1EP*2x2mm*P0.65mm*; Footprint: Package_SON:WSON-6-1EP_2x2mm_P0.65mm_EP1x1.6mm; Datasheet: http://www.ti.com/lit/ds/symlink/tlv755p.pdf
pins: 1 OUT, 2 NC hidden, 3 GND, 4 EN, 5 NC hidden, 6 IN, 7 GND hidden

## TLV75530PDBV
designator *  value TLV75530PDBV  Reference: U
ki_keywords: LDO Regulator Fixed Positive; ki_description: 500mA Low Dropout Voltage Regulator, Fixed Output 3.0V, SOT-23-5; ki_fp_filters: SOT?23*; Footprint: Package_TO_SOT_SMD:SOT-23-5; Datasheet: http://www.ti.com/lit/ds/symlink/tlv755p.pdf
pins: 1 IN, 2 GND, 3 EN, 4 NC hidden, 5 OUT

## TLV75530PDRV
designator *  value TLV75530PDRV  Reference: U
ki_keywords: LDO Regulator Fixed Positive; ki_description: 500mA Low Dropout Voltage Regulator, Fixed Output 3.0V, WSON6; ki_fp_filters: WSON*1EP*2x2mm*P0.65mm*; Footprint: Package_SON:WSON-6-1EP_2x2mm_P0.65mm_EP1x1.6mm; Datasheet: http://www.ti.com/lit/ds/symlink/tlv755p.pdf
pins: 1 OUT, 2 NC hidden, 3 GND, 4 EN, 5 NC hidden, 6 IN, 7 GND hidden
